# Altium footprint library 3D_MIG_Controller.PCBLIB: 560 footprints (part 35 of 35)
Each footprint in its own frame and in the unit in brackets; x right, y up, seen from the top. Pads: shape width x height; smd on the part's side, far side on the other; paste and mask are expansions set on the pad; w line width, h text height; cw(c..) or ccw(c..) is an arc to the next point about the centre after c.
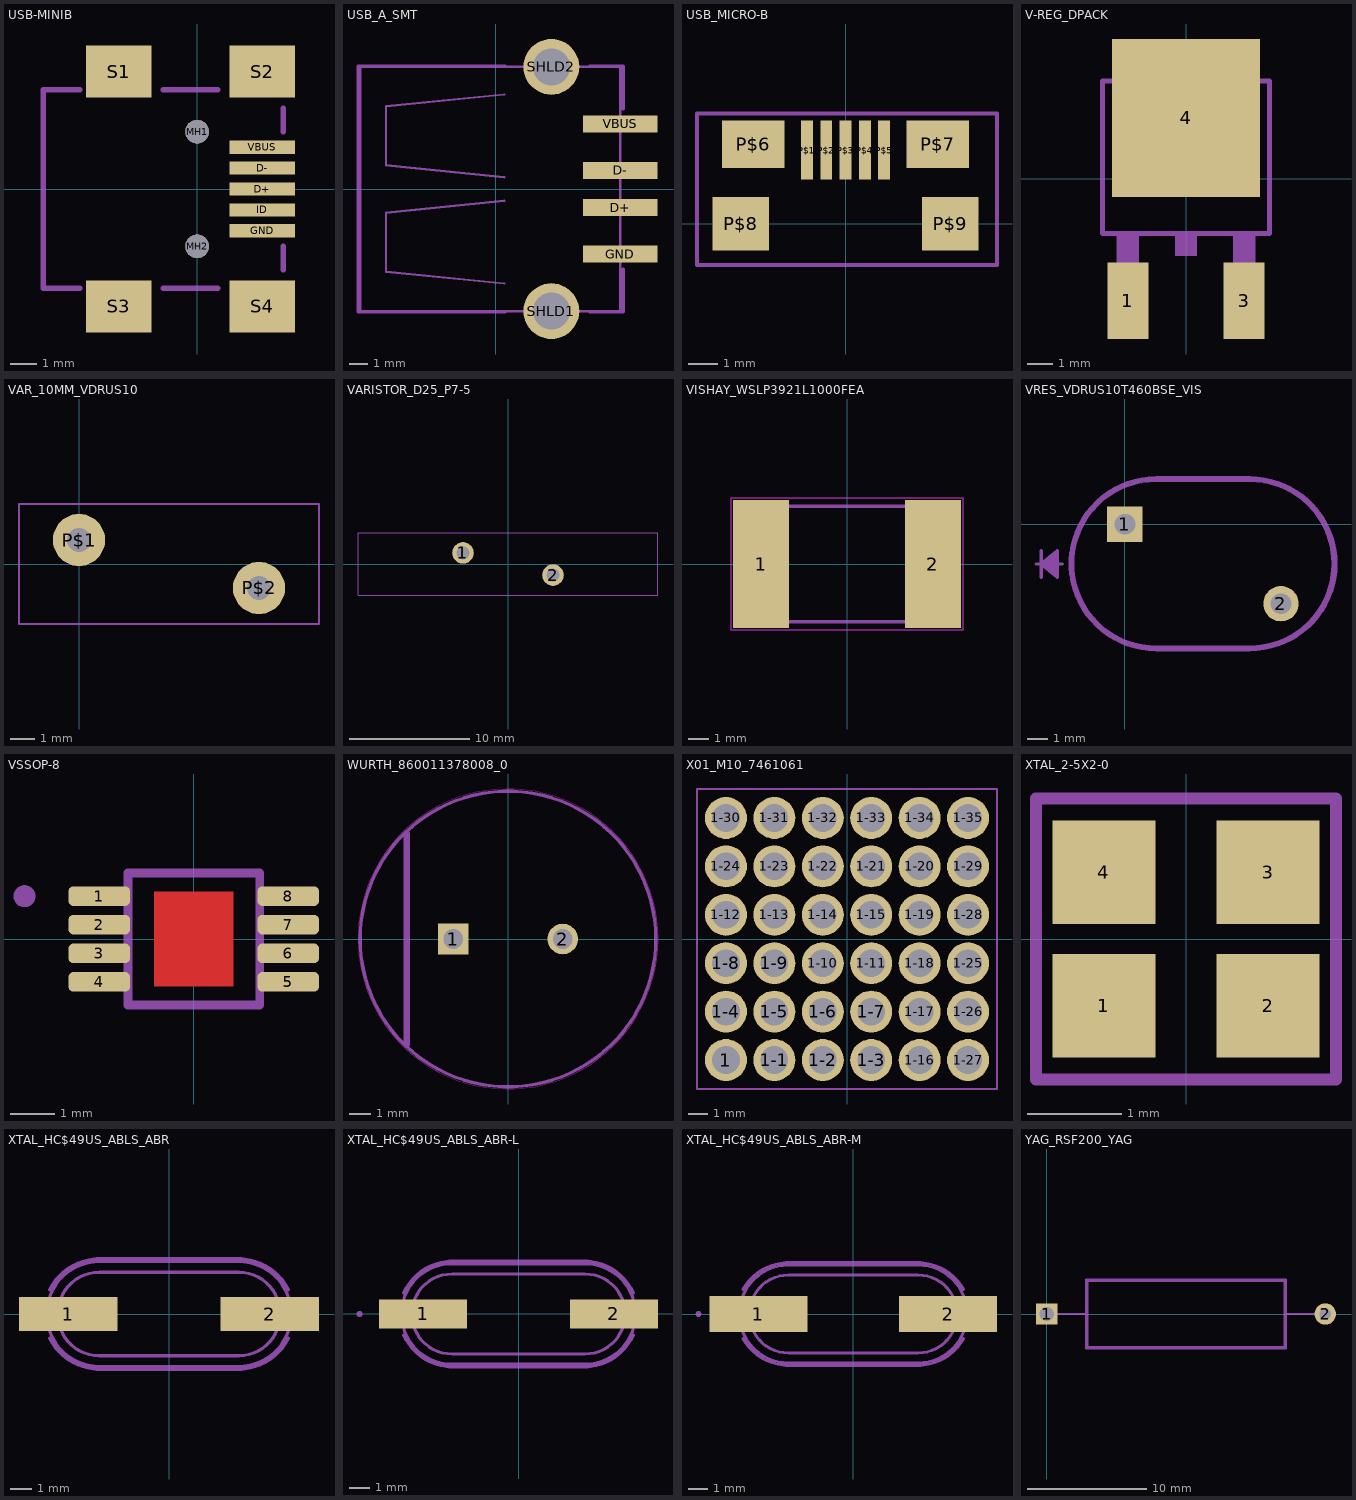
[diagram p34: the footprints below, top view; thin cyan lines are the x and y axes]

## USB-MINIB [mm]
pads (11):
  rect 2.5x0.5 smd: D+(2.5,0) D-(2.5,0.8) GND(2.5,-1.6) ID(2.5,-0.8) VBUS(2.5,1.6)
  round 0.9 hole 0.9 unplated: MH1(0,2.2) MH2(0,-2.2)
  rect 2.5x2 smd: S1(-3,4.5) S2(2.5,4.5) S3(-3,-4.5) S4(2.5,-4.5)
tDocu:
  lines w0.203: -4.5,-3.8 -5.9,-3.8 -5.9,3.8 -4.5,3.8
tPlace:
  lines w0.203: -1.3,-3.8 0.8,-3.8 ; -1.3,3.8 0.8,3.8 ; 3.3,-3.1 3.3,-2.2 ; 3.3,2.2 3.3,3.1

## USB_A_SMT [mm]
pads (6):
  rect 4x0.9 smd: D+(6.7,-1) D-(6.7,1) GND(6.7,-3.5) VBUS(6.7,3.5)
  round 3 hole 2: SHLD1(3,-6.566) SHLD2(3,6.566)
tDocu:
  lines w0.127: -7.287,-6.566 6.696,-6.566 ; -7.287,-6.477 -7.287,6.477 ; -7.287,6.566 6.696,6.566 ; 0.46,-5.08 -5.89,-4.445 -5.89,-1.27 0.46,-0.635 ; 0.46,0.635 -5.89,1.27 -5.89,4.445 0.46,5.08 ; 6.708,-6.502 6.708,6.502
tPlace:
  lines w0.203: 0.508,-6.604 -7.366,-6.604 -7.366,6.604 0.508,6.604 ; 5.08,-6.604 6.858,-6.604 6.858,-4.318 ; 5.08,6.604 6.858,6.604 6.858,4.318

## USB_MICRO-B [mm]
pads (9):
  rect 0.4x2 smd: P$1(-1.3,2.475) P$2(-0.65,2.475) P$3(0,2.475) P$4(0.65,2.475) P$5(1.3,2.475)
  rect 2.1x1.6 smd: P$6(-3.1,2.675) P$7(3.1,2.675)
  rect 1.9x1.8 smd: P$8(-3.525,0) P$9(3.525,0)
tPlace:
  lines w0.127: -5,-1.4 5.1,-1.4 5.1,3.7 -5,3.7 -5,-1.4

## V-REG_DPACK [mm]
pads (3):
  rect 1.6x3 smd: 1(-2.28,-4.8) 3(2.28,-4.8)
  rect 5.8x6.2 smd: 4(0,2.38)
tDocu:
  region: -2.718,-5.156 -2.718,-2.261 -1.854,-2.261 -1.854,-5.156
  region: 1.854,-5.156 1.854,-2.261 2.718,-2.261 2.718,-5.156
  region: -2.565,3.937 -2.565,4.648 -2.108,5.105 2.108,5.105 2.565,4.648 2.565,3.937
  lines w0.203: -3.277,3.835 3.277,3.835 ; -2.565,3.937 -2.565,4.648 -2.108,5.105 2.108,5.105 2.565,4.648 2.565,3.937 -2.565,3.937
tPlace:
  region: -0.432,-3.023 -0.432,-2.261 0.432,-2.261 0.432,-3.023
  lines w0.203: -3.277,3.835 -3.277,-2.159 3.277,-2.159 3.277,3.835

## VAR_10MM_VDRUS10 [mil]
pads (2):
  round 86 hole 39.37: P$1(0,39.37) P$2(295.28,-39.37)
tPlace:
  lines w3.94: -98.43,86.61 -98.43,98.43 ; -98.43,98.43 393.7,98.43 393.7,-98.43 -98.43,-98.43 -98.43,98.43

## VARISTOR_D25_P7-5 [mil]
pads (2):
  round 70.87 hole 43.31: 1(-147.64,36.42) 2(147.64,-36.42)
tPlace:
  lines w3.94: -492.13,-102.36 -492.13,102.36 492.13,102.36 492.13,-102.36 -492.13,-102.36

## VISHAY_WSLP3921L1000FEA [mil]
pads (2):
  rect 106.3x244.09 smd: 1(-163.39,0) 2(163.39,0)
Top keep-out:
  lines w3.94: -220.47,-125.98 -220.47,125.98 220.47,125.98 220.47,-125.98 -220.47,-125.98
tDocu:
  lines w5.91: -201.85,-109.84 -201.85,109.84 201.85,109.84 201.85,-109.84 -201.85,-109.84
tPlace:
  lines w5.91: -95.47,-109.84 95.47,-109.84 ; -95.47,109.84 95.47,109.84

## VRES_VDRUS10T460BSE_VIS [mm]
pads (2):
  rect 1.7x1.7 / inner round 1.571 / far side rect 1.7x1.7 hole 1: 1(0,0)
  round 1.7 hole 1: 2(7.493,-3.81)
tDocu:
  lines w0.152: -4.267,-1.905 -4.013,-1.905 ; -4.013,-2.54 -4.013,-1.905 ; -4.013,-1.27 -4.013,-1.905 ; -3.251,-2.413 -4.013,-1.905 ; -3.251,-2.286 -4.013,-1.905 ; -3.251,-2.159 -4.013,-1.905 ; -3.251,-2.032 -4.013,-1.905 ; -3.251,-1.778 -4.013,-1.905 ; -3.251,-1.651 -4.013,-1.905 ; -3.251,-1.524 -4.013,-1.905 ; -3.251,-1.397 -4.013,-1.905 ; -2.997,-1.905 -4.013,-1.905 ; -4.013,-1.905 -3.251,-1.27 -3.251,-2.54 -4.013,-1.905 ; 1.499,-5.893 5.994,-5.893 ccw(c5.994,-1.892) 5.994,2.108 1.499,2.108 ccw(c1.499,-1.892) 1.499,-5.893
tPlace:
  lines w0.152: -4.267,-1.905 -4.013,-1.905 ; -4.013,-2.54 -4.013,-1.905 ; -4.013,-1.27 -4.013,-1.905 ; -3.251,-2.413 -4.013,-1.905 ; -3.251,-2.286 -4.013,-1.905 ; -3.251,-2.159 -4.013,-1.905 ; -3.251,-2.032 -4.013,-1.905 ; -3.251,-1.778 -4.013,-1.905 ; -3.251,-1.651 -4.013,-1.905 ; -3.251,-1.524 -4.013,-1.905 ; -3.251,-1.397 -4.013,-1.905 ; -2.997,-1.905 -4.013,-1.905 ; -4.013,-1.905 -3.251,-1.27 -3.251,-2.54 -4.013,-1.905 ; 1.499,-6.02 5.994,-6.02 ccw(c6.007,-1.892) 10.135,-1.905 ccw(c5.994,-1.905) 5.994,2.235 1.499,2.235 ccw(c1.499,-1.892) 1.499,-6.02

## VSSOP-8 [mil]
pads (8):
  rrect50% 55.12x17.72 smd: 1(-84.68,38.39) 2(-84.68,12.8) 3(-84.68,-12.8) 4(-84.68,-38.39) 5(84.68,-38.39) 6(84.68,-12.8) 7(84.68,12.8) 8(84.68,38.39)
Top:
  region: -35.43,-42.32 -35.43,42.32 35.43,42.32 35.43,-42.32
tDocu:
  lines w3.94: -19.69,0 19.69,0 ; 0,-19.69 0,19.69
  lines w7.87: -59.06,-59.06 -59.06,59.06 59.06,59.06 59.06,-59.06 -59.06,-59.06
tPlace:
  circle w9.84: c-151.74,38.39 r4.92
  lines w7.87: -33.37,-59.06 33.37,-59.06 ; -33.37,59.06 33.37,59.06

## WURTH_860011378008_0 [mil]
pads (2):
  rect 55.12x55.12 / inner round 50.92 / far side rect 55.12x55.12 hole 35.43: 1(-98.43,0)
  round 55.12 hole 35.43: 2(98.43,0)
Top keep-out:
  circle w0: c0,0 r269.69
tDocu:
  circle w5.91: c0,0 r265.75
tPlace:
  circle w5.91: c0,0 r265.75
  lines w11.81: -182.09,-188.98 -182.09,188.98

## X01_M10_7461061 [mil]
pads (36):
  round 86.61 hole 57.09: 1(-250,-250) 1-1(-150,-250) 1-2(-50,-250) 1-3(50,-250) 1-4(-250,-150) 1-5(-150,-150) 1-6(-50,-150) 1-7(50,-150) 1-8(-250,-50) 1-9(-150,-50) 1-10(-50,-50) 1-11(50,-50) 1-12(-250,50) 1-13(-150,50) 1-14(-50,50) 1-15(50,50) 1-16(150,-250) 1-17(150,-150) 1-18(150,-50) 1-19(150,50) 1-20(150,150) 1-21(50,150) 1-22(-50,150) 1-23(-150,150) 1-24(-250,150) 1-25(250,-50) 1-26(250,-150) 1-27(250,-250) 1-28(250,50) 1-29(250,150) 1-30(-250,250) 1-31(-150,250) 1-32(-50,250) 1-33(50,250) 1-34(150,250) 1-35(250,250)
tPlace:
  lines w3.94: -309.84,-309.84 309.84,-309.84 309.84,309.84 -309.84,309.84 -309.84,-309.84

## XTAL_2-5X2-0 [mil]
pads (4):
  rect 43.31x43.31 smd: 1(-34.45,-28.05) 2(34.45,-28.05) 3(34.45,28.05) 4(-34.45,28.05)
tPlace:
  lines w5: -62.99,-59.06 62.99,-59.06 62.99,59.06 -62.99,59.06 -62.99,-59.06
  text "*" at -74.8,-74.8 h24.8

## XTAL_HC$49US_ABLS_ABR [mil]
pads (2):
  rect 184x64 smd: 1(-188,0) 2(188,0)
tDocu:
  lines w6: -130,-98 130,-98 ccw(c130,0) 130,98 -130,98 ccw(c-130,0) -130,-98 ; -130,-78 130,-78 ccw(c130,0) 130,78 -130,78 ccw(c-130,0) -130,-78
tPlace:
  lines w6: -223,-45 ccw(c-130.09,0.42) -130,-103 ; -223,45 cw(c-130.09,-0.42) -130,103 ; -135,-103 -130,-103 ; -135,103 -130,103 ; 135,-103 130,-103 ; 135,103 130,103 ; 223,-45 cw(c130.09,0.42) 130,-103 ; 223,45 ccw(c130.09,-0.42) 130,103 ; -130,-103 130,-103 ; -130,103 130,103

## XTAL_HC$49US_ABLS_ABR-L [mil]
pads (2):
  rect 172x56 smd: 1(-186,0) 2(186,0)
tDocu:
  lines w0: -258,0 ccw(c-255,0) -252,0 ccw(c-255,0) -258,0
  lines w6: -130,-98 130,-98 ccw(c130,0) 130,98 -130,98 ccw(c-130,0) -130,-98 ; -130,-78 130,-78 ccw(c130,0) 130,78 -130,78 ccw(c-130,0) -130,-78
tPlace:
  lines w6: -224,-41 ccw(c-129.26,0.37) -130,-103 ; -224,41 cw(c-129.26,-0.37) -130,103 ; -135,-103 -130,-103 ; -135,103 -130,103 ; 135,-103 130,-103 ; 135,103 130,103 ; 224,-41 cw(c129.26,0.37) 130,-103 ; 224,41 ccw(c129.26,-0.37) 130,103 ; -130,-103 130,-103 ; -130,103 130,103 ; -313,0 ccw(c-310,0) -307,0 ccw(c-310,0) -313,0

## XTAL_HC$49US_ABLS_ABR-M [mil]
pads (2):
  rect 196x72 smd: 1(-190,0) 2(190,0)
tDocu:
  lines w0: -258,0 ccw(c-255,0) -252,0 ccw(c-255,0) -258,0
  lines w6: -130,-98 130,-98 ccw(c130,0) 130,98 -130,98 ccw(c-130,0) -130,-98 ; -130,-78 130,-78 ccw(c130,0) 130,78 -130,78 ccw(c-130,0) -130,-78
tPlace:
  lines w6: -221,-49 ccw(c-129.66,1.24) -130,-103 ; -221,49 cw(c-129.66,-1.24) -130,103 ; -135,-103 -130,-103 ; -135,103 -130,103 ; 135,-103 130,-103 ; 135,103 130,103 ; 221,-49 cw(c129.66,1.24) 130,-103 ; 221,49 ccw(c129.66,-1.24) 130,103 ; -130,-103 130,-103 ; -130,103 130,103 ; -313,0 ccw(c-310,0) -307,0 ccw(c-310,0) -313,0

## YAG_RSF200_YAG [mil]
pads (2):
  rect 70.87x70.87 / inner round 65.48 / far side rect 70.87x70.87 hole 47.24: 1(0,0)
  round 70.87 hole 39.37: 2(920,0)
tDocu:
  lines w6: 0,0 135,0 ; 920,0 785,0 ; 135,0 135,-108 785,-108 785,0 ; 135,0 135,108 785,108 785,0
tPlace:
  lines w6: 130,-114 790,-114 790,114 130,114 130,-114